# Altium schematic symbol library FPGA_Xilinx_Virtex7.SchLib: 34 symbols (part 7 of 34)
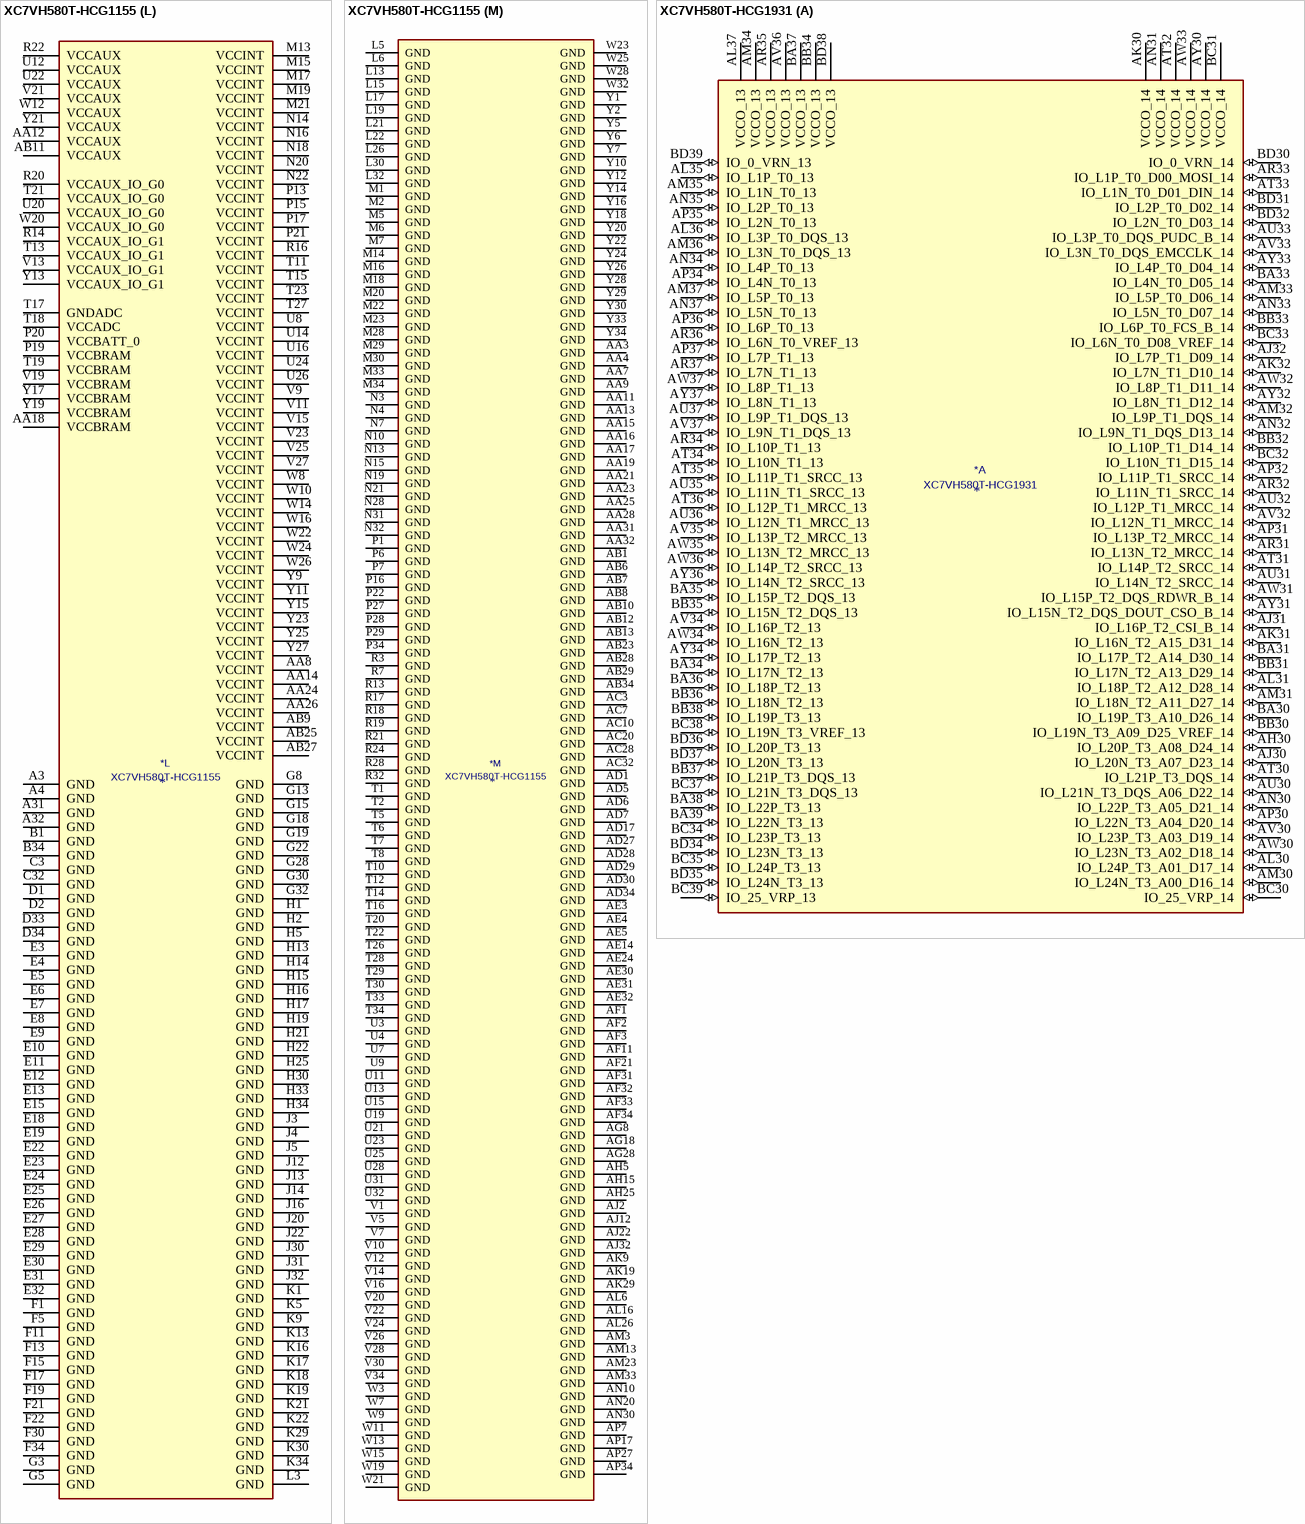
[diagram p178: symbols XC7VH580T-HCG1155 to XC7VH580T-HCG1931]

## XC7VH580T-HCG1155
designator *  value XC7VH580T-HCG1155
ki_keywords: FPGA; ki_description: Virtex 7 HT 580 XC7VH580T-FLG1155
part A pins: AB24 IO_L5P_T0_13 (io), AC23 IO_L1P_T0_13 (io), AC24 IO_L5N_T0_13 (io), AC25 VCCO_13 (power), AC26 IO_L4P_T0_13 (io), AC27 IO_L4N_T0_13 (io), AD23 IO_L1N_T0_13 (io), AD24 IO_L2P_T0_13 (io), AD25 IO_L2N_T0_13 (io), AD26 IO_L3P_T0_DQS_13 (io), AE23 IO_L16P_T2_13 (io), AE25 IO_L17P_T2_13 (io), AE26 IO_L3N_T0_DQS_13 (io), AE27 IO_L6P_T0_13 (io), AE28 IO_L1P_T0_D00_MOSI_14 (io), AE29 VCCO_14 (power), AF23 IO_L16N_T2_13 (io), AF24 IO_L15P_T2_DQS_13 (io), AF25 IO_L17N_T2_13 (io), AF26 VCCO_13 (power), AF27 IO_L6N_T0_VREF_13 (io), AF28 IO_L1N_T0_D01_DIN_14 (io), AF29 IO_L3P_T0_DQS_PUDC_B_14 (io), AF30 IO_L7P_T1_D09_14 (io), AG23 VCCO_13 (power), AG24 IO_L15N_T2_DQS_13 (io), AG25 IO_L14P_T2_SRCC_13 (io), AG26 IO_L14N_T2_SRCC_13 (io), AG27 IO_L7P_T1_13 (io), AG29 IO_L3N_T0_DQS_EMCCLK_14 (io), AG30 IO_L7N_T1_D10_14 (io), AG31 IO_L8P_T1_D11_14 (io), AG32 IO_L8N_T1_D12_14 (io), AG33 VCCO_14 (power), AG34 IO_L10P_T1_D14_14 (io), AH23 IO_L18P_T2_13 (io), AH24 IO_L13P_T2_MRCC_13 (io), AH26 IO_L9P_T1_DQS_13 (io), AH27 IO_L7N_T1_13 (io), AH28 IO_L4P_T0_D04_14 (io), AH29 IO_L4N_T0_D05_14 (io), AH30 VCCO_14 (power), AH31 IO_L11P_T1_SRCC_14 (io), AH32 IO_L9P_T1_DQS_14 (io), AH33 IO_L9N_T1_DQS_D13_14 (io), AH34 IO_L10N_T1_D15_14 (io), AJ23 IO_L18N_T2_13 (io), AJ24 IO_L13N_T2_MRCC_13 (io), AJ25 IO_L11P_T1_SRCC_13 (io), AJ26 IO_L9N_T1_DQS_13 (io), AJ27 VCCO_13 (power), AJ28 IO_L5P_T0_D06_14 (io), AJ29 IO_L2P_T0_D02_14 (io), AJ30 IO_L2N_T0_D03_14 (io), AJ31 IO_L11N_T1_SRCC_14 (io), AJ33 IO_L17P_T2_A14_D30_14 (io), AJ34 IO_L17N_T2_A13_D29_14 (io), AK23 IO_L20P_T3_13 (io), AK24 VCCO_13 (power), AK25 IO_L11N_T1_SRCC_13 (io), AK26 IO_L8P_T1_13 (io), AK27 IO_L8N_T1_13 (io), AK28 IO_L5N_T0_D07_14 (io), AK30 IO_L12P_T1_MRCC_14 (io), AK31 IO_L12N_T1_MRCC_14 (io), AK32 IO_L13P_T2_MRCC_14 (io), AK33 IO_L14P_T2_SRCC_14 (io), AK34 VCCO_14 (power), AL22 IO_L24P_T3_13 (io), AL23 IO_L20N_T3_13 (io), AL24 IO_L12P_T1_MRCC_13 (io), AL25 IO_L12N_T1_MRCC_13 (io), AL27 IO_0_VRN_13 (io), AL28 IO_L6P_T0_FCS_B_14 (io), AL29 IO_L6N_T0_D08_VREF_14 (io), AL30 IO_L21P_T3_DQS_14 (io), AL31 VCCO_14 (power), AL32 IO_L13N_T2_MRCC_14 (io), AL33 IO_L14N_T2_SRCC_14 (io), AL34 IO_L16P_T2_CSI_B_14 (io), AM22 IO_L24N_T3_13 (io), AM24 IO_L23P_T3_13 (io), AM25 IO_L10P_T1_13 (io), AM26 IO_L10N_T1_13 (io), AM27 IO_L20P_T3_A08_D24_14 (io), AM28 VCCO_14 (power), AM29 IO_L19P_T3_A10_D26_14 (io), AM30 IO_L21N_T3_DQS_A06_D22_14 (io), AM31 IO_L23P_T3_A03_D19_14 (io), AM32 IO_L15P_T2_DQS_RDWR_B_14 (io), AM34 IO_L16N_T2_A15_D31_14 (io), AN22 IO_25_VRP_13 (io), AN23 IO_L21P_T3_DQS_13 (io), AN24 IO_L23N_T3_13 (io), AN25 VCCO_13 (power), AN26 IO_L22P_T3_13 (io), AN27 IO_L20N_T3_A07_D23_14 (io), AN28 IO_L24P_T3_A01_D17_14 (io), AN29 IO_L19N_T3_A09_D25_VREF_14 (io), AN31 IO_L23N_T3_A02_D18_14 (io), AN32 IO_L15N_T2_DQS_DOUT_CSO_B_14 (io), AN33 IO_L18P_T2_A12_D28_14 (io), AN34 IO_0_VRN_14 (io), AP22 VCCO_13 (power), AP23 IO_L21N_T3_DQS_13 (io), AP24 IO_L19P_T3_13 (io), AP25 IO_L19N_T3_VREF_13 (io), AP26 IO_L22N_T3_13 (io), AP28 IO_L24N_T3_A00_D16_14 (io), AP29 IO_L22P_T3_A05_D21_14 (io), AP30 IO_L22N_T3_A04_D20_14 (io), AP31 IO_25_VRP_14 (io), AP32 VCCO_14 (power), AP33 IO_L18N_T2_A11_D27_14 (io)
part B pins: AA20 IO_L5P_T0_AD9P_15 (io), AA22 VCCO_15 (power), AB18 VCCO_15 (power), AB19 IO_0_VRN_15 (io), AB20 IO_L5N_T0_AD9N_15 (io), AB21 IO_L20P_T3_A20_15 (io), AB22 IO_L22P_T3_A17_15 (io), AC18 IO_L1P_T0_AD0P_15 (io), AC19 IO_L3P_T0_DQS_AD1P_15 (io), AC21 IO_L20N_T3_A19_15 (io), AC22 IO_L22N_T3_A16_15 (io), AD18 IO_L1N_T0_AD0N_15 (io), AD19 IO_L3N_T0_DQS_AD1N_15 (io), AD20 IO_L16P_T2_A28_15 (io), AD21 IO_L21P_T3_DQS_15 (io), AD22 VCCO_15 (power), AE18 IO_L4P_T0_15 (io), AE19 VCCO_15 (power), AE20 IO_L16N_T2_A27_15 (io), AE21 IO_L21N_T3_DQS_A18_15 (io), AE22 IO_L24P_T3_RS1_15 (io), AF18 IO_L4N_T0_15 (io), AF19 IO_L6P_T0_15 (io), AF20 IO_L18P_T2_A24_15 (io), AF22 IO_L24N_T3_RS0_15 (io), AG19 IO_L6N_T0_VREF_15 (io), AG20 IO_L18N_T2_A23_15 (io), AG21 IO_25_VRP_15 (io), AG22 IO_L23P_T3_FOE_B_15 (io), AH18 IO_L2P_T0_AD8P_15 (io), AH19 IO_L2N_T0_AD8N_15 (io), AH20 VCCO_15 (power), AH21 IO_L17P_T2_A26_15 (io), AH22 IO_L23N_T3_FWE_B_15 (io), AJ18 IO_L15P_T2_DQS_15 (io), AJ19 IO_L15N_T2_DQS_ADV_B_15 (io), AJ20 IO_L13P_T2_MRCC_15 (io), AJ21 IO_L17N_T2_A25_15 (io), AK18 IO_L7P_T1_AD2P_15 (io), AK20 IO_L13N_T2_MRCC_15 (io), AK21 IO_L19P_T3_A22_15 (io), AK22 IO_L19N_T3_A21_VREF_15 (io), AL18 IO_L7N_T1_AD2N_15 (io), AL19 IO_L14P_T2_SRCC_15 (io), AL20 IO_L14N_T2_SRCC_15 (io), AL21 VCCO_15 (power), AM18 VCCO_15 (power), AM19 IO_L12P_T1_MRCC_15 (io), AM20 IO_L12N_T1_MRCC_15 (io), AM21 IO_L11P_T1_SRCC_15 (io), AN18 IO_L10P_T1_AD11P_15 (io), AN19 IO_L9P_T1_DQS_AD3P_15 (io), AN21 IO_L11N_T1_SRCC_15 (io), AP18 IO_L10N_T1_AD11N_15 (io), AP19 IO_L9N_T1_DQS_AD3N_15 (io), AP20 IO_L8P_T1_AD10P_15 (io), AP21 IO_L8N_T1_AD10N_15 (io), F23 IO_25_VRP_16 (io), F24 IO_L8P_T1_16 (io), F25 IO_L8N_T1_16 (io), F26 VCCO_16 (power), F27 IO_L19P_T3_16 (io), F28 IO_L19N_T3_VREF_16 (io), F29 VCCO_16 (power), G23 VCCO_16 (power), G24 IO_L9N_T1_DQS_16 (io), G25 IO_L10P_T1_16 (io), G26 IO_L10N_T1_16 (io), G27 IO_L22N_T3_16 (io), G29 IO_L23N_T3_16 (io), H23 IO_L7P_T1_16 (io), H24 IO_L9P_T1_DQS_16 (io), H26 IO_L12N_T1_MRCC_16 (io), H27 IO_L22P_T3_16 (io), H28 IO_L21N_T3_DQS_16 (io), H29 IO_L23P_T3_16 (io), J23 IO_L6N_T0_VREF_16 (io), J24 IO_L7N_T1_16 (io), J25 IO_L11N_T1_SRCC_16 (io), J26 IO_L12P_T1_MRCC_16 (io), J27 VCCO_16 (power), J28 IO_L21P_T3_DQS_16 (io), J29 IO_L20N_T3_16 (io), K23 IO_L6P_T0_16 (io), K24 VCCO_16 (power), K25 IO_L11P_T1_SRCC_16 (io), K26 IO_L13P_T2_MRCC_16 (io), K27 IO_L13N_T2_MRCC_16 (io), K28 IO_L20P_T3_16 (io), L23 IO_L2P_T0_16 (io), L24 IO_L2N_T0_16 (io), L25 IO_L14N_T2_SRCC_16 (io), L27 IO_L17N_T2_16 (io), L28 IO_L24P_T3_16 (io), L29 IO_L24N_T3_16 (io), M24 IO_0_VRN_16 (io), M25 IO_L14P_T2_SRCC_16 (io), M26 IO_L17P_T2_16 (io), M27 IO_L18N_T2_16 (io), N23 IO_L4N_T0_16 (io), N24 IO_L3N_T0_DQS_16 (io), N25 VCCO_16 (power), N26 IO_L15N_T2_DQS_16 (io), N27 IO_L18P_T2_16 (io), P23 IO_L4P_T0_16 (io), P24 IO_L3P_T0_DQS_16 (io), P25 IO_L5N_T0_16 (io), P26 IO_L15P_T2_DQS_16 (io), R23 IO_L1P_T0_16 (io), R25 IO_L5P_T0_16 (io), R26 IO_L16P_T2_16 (io), R27 IO_L16N_T2_16 (io), T24 IO_L1N_T0_16 (io), T25 VCCO_16 (power)
part C pins: AC8 IO_L4P_T0_33 (io), AC9 IO_L2P_T0_33 (io), AC11 IO_L1N_T0_33 (io), AC12 IO_L1P_T0_33 (io), AD8 IO_L4N_T0_33 (io), AD9 IO_L2N_T0_33 (io), AD10 IO_L3N_T0_DQS_33 (io), AD11 IO_L3P_T0_DQS_33 (io), AD12 VCCO_33 (power), AE6 IO_L1P_T0_34 (io), AE7 IO_L5P_T0_34 (io), AE8 IO_L6P_T0_33 (io), AE9 VCCO_33 (power), AE10 IO_L5N_T0_33 (io), AE11 IO_L5P_T0_33 (io), AE12 IO_L16P_T2_33 (io), AF4 IO_L7P_T1_34 (io), AF5 IO_L1N_T0_34 (io), AF6 VCCO_34 (power), AF7 IO_L5N_T0_34 (io), AF8 IO_L6N_T0_VREF_33 (io), AF9 IO_L17P_T2_33 (io), AF10 IO_L15P_T2_DQS_33 (io), AF12 IO_L16N_T2_33 (io), AG1 IO_L10P_T1_34 (io), AG2 IO_L9P_T1_DQS_34 (io), AG3 VCCO_34 (power), AG4 IO_L7N_T1_34 (io), AG5 IO_L2N_T0_34 (io), AG6 IO_L2P_T0_34 (io), AG7 IO_L4P_T0_34 (io), AG9 IO_L17N_T2_33 (io), AG10 IO_L15N_T2_DQS_33 (io), AG11 IO_L13P_T2_MRCC_33 (io), AG12 IO_L18P_T2_33 (io), AH1 IO_L10N_T1_34 (io), AH2 IO_L9N_T1_DQS_34 (io), AH3 IO_L8N_T1_34 (io), AH4 IO_L8P_T1_34 (io), AH6 IO_L3P_T0_DQS_34 (io), AH7 IO_L4N_T0_34 (io), AH8 IO_L7N_T1_33 (io), AH9 IO_L7P_T1_33 (io), AH10 VCCO_33 (power), AH11 IO_L13N_T2_MRCC_33 (io), AH12 IO_L18N_T2_33 (io), AJ1 IO_L17P_T2_34 (io), AJ3 IO_L11N_T1_SRCC_34 (io), AJ4 IO_L11P_T1_SRCC_34 (io), AJ5 IO_L12P_T1_MRCC_34 (io), AJ6 IO_L3N_T0_DQS_34 (io), AJ7 VCCO_34 (power), AJ8 IO_L9N_T1_DQS_33 (io), AJ9 IO_L9P_T1_DQS_33 (io), AJ10 IO_L14N_T2_SRCC_33 (io), AJ11 IO_L14P_T2_SRCC_33 (io), AK1 IO_L17N_T2_34 (io), AK2 IO_L14P_T2_SRCC_34 (io), AK3 IO_L13P_T2_MRCC_34 (io), AK4 VCCO_34 (power), AK5 IO_L12N_T1_MRCC_34 (io), AK6 IO_L6N_T0_VREF_34 (io), AK7 IO_L6P_T0_34 (io), AK8 IO_L8P_T1_33 (io), AK10 IO_L11N_T1_SRCC_33 (io), AK11 IO_L11P_T1_SRCC_33 (io), AK12 IO_L20P_T3_33 (io), AL1 VCCO_34 (power), AL2 IO_L14N_T2_SRCC_34 (io), AL3 IO_L13N_T2_MRCC_34 (io), AL4 IO_L23N_T3_34 (io), AL5 IO_L23P_T3_34 (io), AL7 IO_L20P_T3_34 (io), AL8 IO_L8N_T1_33 (io), AL9 IO_L12N_T1_MRCC_33 (io), AL10 IO_L12P_T1_MRCC_33 (io), AL11 VCCO_33 (power), AL12 IO_L20N_T3_33 (io), AM1 IO_L16P_T2_34 (io), AM2 IO_L15P_T2_DQS_34 (io), AM4 IO_L21P_T3_DQS_34 (io), AM5 IO_L19N_T3_VREF_34 (io), AM6 IO_L19P_T3_34 (io), AM7 IO_L20N_T3_34 (io), AM8 VCCO_33 (power), AM9 IO_L10N_T1_33 (io), AM10 IO_L10P_T1_33 (io), AM11 IO_L24N_T3_33 (io), AM12 IO_L24P_T3_33 (io), AN1 IO_L16N_T2_34 (io), AN2 IO_L15N_T2_DQS_34 (io), AN3 IO_L18P_T2_34 (io), AN4 IO_L21N_T3_DQS_34 (io), AN5 VCCO_34 (power), AN6 IO_L24N_T3_34 (io), AN7 IO_L24P_T3_34 (io), AN8 IO_L22N_T3_33 (io), AN9 IO_L22P_T3_33 (io), AN11 IO_L21N_T3_DQS_33 (io), AN12 IO_L21P_T3_DQS_33 (io), AN13 IO_L23P_T3_33 (io), AP1 IO_0_VRN_34 (io), AP2 VCCO_34 (power), AP3 IO_L18N_T2_34 (io), AP4 IO_25_VRP_34 (io), AP5 IO_L22N_T3_34 (io), AP6 IO_L22P_T3_34 (io), AP8 IO_0_VRN_33 (io), AP9 IO_L19N_T3_VREF_33 (io), AP10 IO_L19P_T3_33 (io), AP11 IO_25_VRP_33 (io), AP12 VCCO_33 (power), AP13 IO_L23N_T3_33 (io)
part D pins: AB14 IO_L20P_T3_35 (io), AB15 IO_0_VRN_35 (io), AB16 IO_L4P_T0_35 (io), AB17 IO_L1P_T0_AD4P_35 (io), AC13 IO_L22P_T3_35 (io), AC14 IO_L20N_T3_35 (io), AC15 VCCO_35 (power), AC16 IO_L4N_T0_35 (io), AC17 IO_L1N_T0_AD4N_35 (io), AD13 IO_L22N_T3_35 (io), AD14 IO_25_VRP_35 (io), AD15 IO_L16P_T2_35 (io), AD16 IO_L3P_T0_DQS_AD5P_35 (io), AE13 IO_L24P_T3_35 (io), AE15 IO_L16N_T2_35 (io), AE16 IO_L3N_T0_DQS_AD5N_35 (io), AE17 IO_L5P_T0_AD13P_35 (io), AF13 IO_L24N_T3_35 (io), AF14 IO_L21P_T3_DQS_35 (io), AF15 IO_L18P_T2_35 (io), AF16 VCCO_35 (power), AF17 IO_L5N_T0_AD13N_35 (io), AG13 VCCO_35 (power), AG14 IO_L21N_T3_DQS_35 (io), AG15 IO_L18N_T2_35 (io), AG16 IO_L6P_T0_35 (io), AG17 IO_L2P_T0_AD12P_35 (io), AH13 IO_L23P_T3_35 (io), AH14 IO_L19P_T3_35 (io), AH16 IO_L6N_T0_VREF_35 (io), AH17 IO_L2N_T0_AD12N_35 (io), AJ13 IO_L23N_T3_35 (io), AJ14 IO_L19N_T3_VREF_35 (io), AJ15 IO_L13P_T2_MRCC_35 (io), AJ16 IO_L15P_T2_DQS_35 (io), AJ17 VCCO_35 (power), AK13 IO_L17P_T2_35 (io), AK14 VCCO_35 (power), AK15 IO_L13N_T2_MRCC_35 (io), AK16 IO_L15N_T2_DQS_35 (io), AK17 IO_L7P_T1_AD6P_35 (io), AL13 IO_L17N_T2_35 (io), AL14 IO_L14N_T2_SRCC_35 (io), AL15 IO_L14P_T2_SRCC_35 (io), AL17 IO_L7N_T1_AD6N_35 (io), AM14 IO_L11P_T1_SRCC_35 (io), AM15 IO_L12N_T1_MRCC_35 (io), AM16 IO_L12P_T1_MRCC_35 (io), AM17 IO_L9P_T1_DQS_AD7P_35 (io), AN14 IO_L11N_T1_SRCC_35 (io), AN15 VCCO_35 (power), AN16 IO_L8P_T1_AD14P_35 (io), AN17 IO_L9N_T1_DQS_AD7N_35 (io), AP14 IO_L10N_T1_AD15N_35 (io), AP15 IO_L10P_T1_AD15P_35 (io), AP16 IO_L8N_T1_AD14N_35 (io), F6 VCCO_36 (power), F7 IO_L22N_T3_36 (io), F8 IO_L22P_T3_36 (io), F9 IO_L10N_T1_36 (io), F10 IO_25_VRP_36 (io), F12 IO_L8N_T1_36 (io), G6 IO_L23N_T3_36 (io), G7 IO_L21N_T3_DQS_36 (io), G9 IO_L10P_T1_36 (io), G10 IO_L9N_T1_DQS_36 (io), G11 IO_L9P_T1_DQS_36 (io), G12 IO_L8P_T1_36 (io), H6 IO_L23P_T3_36 (io), H7 IO_L21P_T3_DQS_36 (io), H8 IO_L19N_T3_VREF_36 (io), H9 IO_L12N_T1_MRCC_36 (io), H10 VCCO_36 (power), H11 IO_L7N_T1_36 (io), H12 IO_L7P_T1_36 (io), J6 IO_L20N_T3_36 (io), J7 VCCO_36 (power), J8 IO_L19P_T3_36 (io), J9 IO_L12P_T1_MRCC_36 (io), J10 IO_L11N_T1_SRCC_36 (io), J11 IO_L6N_T0_VREF_36 (io), K6 IO_L20P_T3_36 (io), K7 IO_L24N_T3_36 (io), K8 IO_L17N_T2_36 (io), K10 IO_L11P_T1_SRCC_36 (io), K11 IO_L6P_T0_36 (io), K12 IO_L2N_T0_36 (io), L7 IO_L24P_T3_36 (io), L8 IO_L17P_T2_36 (io), L9 IO_L13N_T2_MRCC_36 (io), L10 IO_L14N_T2_SRCC_36 (io), L11 VCCO_36 (power), L12 IO_L2P_T0_36 (io), M8 VCCO_36 (power), M9 IO_L13P_T2_MRCC_36 (io), M10 IO_L14P_T2_SRCC_36 (io), M11 IO_L4N_T0_36 (io), M12 IO_L4P_T0_36 (io), N8 IO_L18N_T2_36 (io), N9 IO_L15N_T2_DQS_36 (io), N11 IO_L3N_T0_DQS_36 (io), N12 IO_0_VRN_36 (io), P8 IO_L18P_T2_36 (io), P9 IO_L15P_T2_DQS_36 (io), P10 IO_L5N_T0_36 (io), P11 IO_L3P_T0_DQS_36 (io), P12 VCCO_36 (power), R8 IO_L16N_T2_36 (io), R9 VCCO_36 (power), R10 IO_L5P_T0_36 (io), R11 IO_L1N_T0_36 (io), R12 IO_L1P_T0_36 (io), T9 IO_L16P_T2_36 (io)
part E pins: AA1 MGTHTXN1_113 (io), AA2 MGTHTXP1_113 (io), AA5 MGTREFCLK1N_113 (io), AA6 MGTREFCLK1P_113 (io), AB3 MGTHRXN2_113 (io), AB4 MGTHRXP2_113 (io), AC1 MGTHTXN0_113 (io), AC2 MGTHTXP0_113 (io), AC5 MGTREFCLK0N_113 (io), AC6 MGTREFCLK0P_113 (io), AD3 MGTHRXN1_113 (io), AD4 MGTHRXP1_113 (io), J1 MGTHTXN3_114 (io), J2 MGTHTXP3_114 (io), K3 MGTHRXN2_114 (io), K4 MGTHRXP2_114 (io), L1 MGTHTXN2_114 (io), L2 MGTHTXP2_114 (io), M3 MGTHRXN3_114 (io), M4 MGTHRXP3_114 (io), N1 MGTHTXN1_114 (io), N2 MGTHTXP1_114 (io), P3 MGTHRXN1_114 (io), P4 MGTHRXP1_114 (io), R1 MGTHTXN0_114 (io), R2 MGTHTXP0_114 (io), T3 MGTHRXN0_114 (io), T4 MGTHRXP0_114 (io), U1 MGTHTXN3_113 (io), U2 MGTHTXP3_113 (io), U5 MGTREFCLK1N_114 (io), U6 MGTREFCLK1P_114 (io), V3 MGTHRXN3_113 (io), V4 MGTHRXP3_113 (io), W1 MGTHTXN2_113 (io), W2 MGTHTXP2_113 (io), W5 MGTREFCLK0N_114 (io), W6 MGTREFCLK0P_114 (io), Y3 MGTHRXN0_113 (io), Y4 MGTHRXP0_113 (io)
part F pins: A1 MGTHTXN3_115 (io), A2 MGTHTXP3_115 (io), AA29 MGTREFCLK1P_213 (io), AA30 MGTREFCLK1N_213 (io), AA33 MGTHTXP1_213 (io), AA34 MGTHTXN1_213 (io), AB31 MGTHRXP2_213 (io), AB32 MGTHRXN2_213 (io), AC29 MGTREFCLK0P_213 (io), AC30 MGTREFCLK0N_213 (io), AC33 MGTHTXP0_213 (io), AC34 MGTHTXN0_213 (io), AD31 MGTHRXP1_213 (io), AD32 MGTHRXN1_213 (io), B3 MGTHRXN3_115 (io), B4 MGTHRXP3_115 (io), C1 MGTHTXN2_115 (io), C2 MGTHTXP2_115 (io), D3 MGTHRXN2_115 (io), D4 MGTHRXP2_115 (io), E1 MGTHTXN1_115 (io), E2 MGTHTXP1_115 (io), F3 MGTHRXN1_115 (io), F4 MGTHRXP1_115 (io), G1 MGTHTXN0_115 (io), G2 MGTHTXP0_115 (io), H3 MGTHRXN0_115 (io), H4 MGTHRXP0_115 (io), N5 MGTREFCLK0N_115 (io), N6 MGTREFCLK0P_115 (io), R5 MGTREFCLK1N_115 (io), R6 MGTREFCLK1P_115 (io), U33 MGTHTXP3_213 (io), U34 MGTHTXN3_213 (io), V31 MGTHRXP3_213 (io), V32 MGTHRXN3_213 (io), W33 MGTHTXP2_213 (io), W34 MGTHTXN2_213 (io), Y31 MGTHRXP0_213 (io), Y32 MGTHRXN0_213 (io)
part G pins: A33 MGTHTXP3_215 (io), A34 MGTHTXN3_215 (io), B31 MGTHRXP3_215 (io), B32 MGTHRXN3_215 (io), C33 MGTHTXP2_215 (io), C34 MGTHTXN2_215 (io), D31 MGTHRXP2_215 (io), D32 MGTHRXN2_215 (io), E33 MGTHTXP1_215 (io), E34 MGTHTXN1_215 (io), F31 MGTHRXP1_215 (io), F32 MGTHRXN1_215 (io), G33 MGTHTXP0_215 (io), G34 MGTHTXN0_215 (io), H31 MGTHRXP0_215 (io), H32 MGTHRXN0_215 (io), J33 MGTHTXP3_214 (io), J34 MGTHTXN3_214 (io), K31 MGTHRXP2_214 (io), K32 MGTHRXN2_214 (io), L33 MGTHTXP2_214 (io), L34 MGTHTXN2_214 (io), M31 MGTHRXP3_214 (io), M32 MGTHRXN3_214 (io), N29 MGTREFCLK0P_215 (io), N30 MGTREFCLK0N_215 (io), N33 MGTHTXP1_214 (io), N34 MGTHTXN1_214 (io), P31 MGTHRXP1_214 (io), P32 MGTHRXN1_214 (io), R29 MGTREFCLK1P_215 (io), R30 MGTREFCLK1N_215 (io), R33 MGTHTXP0_214 (io), R34 MGTHTXN0_214 (io), T31 MGTHRXP0_214 (io), T32 MGTHRXN0_214 (io), U29 MGTREFCLK1P_214 (io), U30 MGTREFCLK1N_214 (io), W29 MGTREFCLK0P_214 (io), W30 MGTREFCLK0N_214 (io)
part H pins: AB2 MGTAVTT_G10 (power), AB5 MGTAVCC_G10 (power), AB30 MGTAVCC_G20 (power), AB33 MGTAVTT_G20 (power), AC4 MGTAVCC_G10 (power), AC31 MGTAVCC_G20 (power), AD2 MGTAVTT_G10 (power), AD33 MGTAVTT_G20 (power), AE1 MGTRREF_115 (power), AE2 MGTAVTTRCAL_115 (power), AE33 MGTAVTTRCAL_215 (power), AE34 MGTRREF_215 (power), B2 MGTAVTT_G10 (power), B33 MGTAVTT_G20 (power), C4 MGTAVCC_G10 (power), C31 MGTAVCC_G20 (power), F2 MGTAVTT_G10 (power), F33 MGTAVTT_G20 (power), G4 MGTAVCC_G10 (power), G31 MGTAVCC_G20 (power), K2 MGTAVTT_G10 (power), K33 MGTAVTT_G20 (power), L4 MGTAVCC_G10 (power), L31 MGTAVCC_G20 (power), P2 MGTAVTT_G10 (power), P5 MGTAVCC_G10 (power), P30 MGTAVCC_G20 (power), P33 MGTAVTT_G20 (power), R4 MGTAVCC_G10 (power), R31 MGTAVCC_G20 (power), V2 MGTAVTT_G10 (power), V6 MGTVCCAUX_G10 (power), V29 MGTVCCAUX_G20 (power), V33 MGTAVTT_G20 (power), W4 MGTAVCC_G10 (power), W31 MGTAVCC_G20 (power)
part I pins: A6 MGTZRXN7_300 (io), A7 MGTZRXP7_300 (io), A9 MGTZRXN5_300 (io), A10 MGTZRXP5_300 (io), A12 MGTZTXN7_300 (io), A13 MGTZTXP7_300 (io), A15 MGTZTXN5_300 (io), A16 MGTZTXP5_300 (io), A18 MGTZRXN3_300 (io), A19 MGTZRXP3_300 (io), A21 MGTZRXN1_300 (io), A22 MGTZRXP1_300 (io), A24 MGTZTXN3_300 (io), A25 MGTZTXP3_300 (io), A27 MGTZTXN1_300 (io), A28 MGTZTXP1_300 (io), C7 MGTZRXN6_300 (io), C8 MGTZRXP6_300 (io), C10 MGTZRXN4_300 (io), C11 MGTZRXP4_300 (io), C13 MGTZTXN6_300 (io), C14 MGTZTXP6_300 (io), C16 MGTZTXN4_300 (io), C17 MGTZTXP4_300 (io), C19 MGTZRXN2_300 (io), C20 MGTZRXP2_300 (io), C22 MGTZRXN0_300 (io), C23 MGTZRXP0_300 (io), C25 MGTZTXN2_300 (io), C26 MGTZTXP2_300 (io), C28 MGTZTXN0_300 (io), C29 MGTZTXP0_300 (io), E16 MGTZREFCLK0N_300 (io), E17 MGTZREFCLK0P_300 (io), E20 MGTZREFCLK1N_300 (io), E21 MGTZREFCLK1P_300 (io), G16 MGTZ_THERM_OUT_300 (io), G17 MGTZ_THERM_IN_300 (io), H18 MGTZ_OBS_CLK_N_300 (io), J18 MGTZ_OBS_CLK_P_300 (io)
part J pins: A5 MGTZAGND_300 (power), A8 MGTZAGND_300 (power), A11 MGTZAGND_300 (power), A14 MGTZAGND_300 (power), A17 MGTZAGND_300 (power), A20 MGTZAGND_300 (power), A23 MGTZAGND_300 (power), A26 MGTZAGND_300 (power), A29 MGTZAGND_300 (power), A30 MGTZAGND_300 (power), B5 MGTZAGND_300 (power), B6 MGTZAVCC_300 (power), B7 MGTZAGND_300 (power), B8 MGTZAVCC_300 (power), B9 MGTZAGND_300 (power), B10 MGTZAVCC_300 (power), B11 MGTZAGND_300 (power), B12 MGTZAVCC_300 (power), B13 MGTZAGND_300 (power), B14 MGTZAVCC_300 (power), B15 MGTZAGND_300 (power), B16 MGTZAVCC_300 (power), B17 MGTZAGND_300 (power), B18 MGTZAVCC_300 (power), B19 MGTZAGND_300 (power), B20 MGTZAVCC_300 (power), B21 MGTZAGND_300 (power), B22 MGTZAVCC_300 (power), B23 MGTZAGND_300 (power), B24 MGTZAVCC_300 (power), B25 MGTZAGND_300 (power), B26 MGTZAVCC_300 (power), B27 MGTZAGND_300 (power), B28 MGTZAVCC_300 (power), B29 MGTZAGND_300 (power), B30 MGTZAGND_300 (power), C5 MGTZAGND_300 (power), C6 MGTZAGND_300 (power), C9 MGTZAGND_300 (power), C12 MGTZAGND_300 (power), C15 MGTZAGND_300 (power), C18 MGTZAGND_300 (power), C21 MGTZAGND_300 (power), C24 MGTZAGND_300 (power), C27 MGTZAGND_300 (power), C30 MGTZAGND_300 (power), D5 MGTZAGND_300 (power), D6 MGTZAGND_300 (power), D7 MGTZAGND_300 (power), D8 MGTZAGND_300 (power), D9 MGTZAGND_300 (power), D10 MGTZAGND_300 (power), D11 MGTZAGND_300 (power), D12 MGTZAGND_300 (power), D13 MGTZAGND_300 (power), D14 MGTZAGND_300 (power), D15 MGTZAGND_300 (power), D16 MGTZAGND_300 (power), D17 MGTZAGND_300 (power), D18 MGTZAGND_300 (power), D19 MGTZAGND_300 (power), D20 MGTZAGND_300 (power), D21 MGTZAGND_300 (power), D22 MGTZAGND_300 (power), D23 MGTZAGND_300 (power), D24 MGTZAGND_300 (power), D25 MGTZAGND_300 (power), D26 MGTZAGND_300 (power), D27 MGTZAGND_300 (power), D28 MGTZAGND_300 (power), D29 MGTZAGND_300 (power), D30 MGTZAGND_300 (power), E14 MGTZ_SENSE_AVCC_300 (power), F14 MGTZ_SENSE_AGND_300 (power), F16 MGTZVCCH_300 (power), F18 MGTZVCCH_300 (power), F20 MGTZVCCH_300 (power), G14 MGTZVCCH_300 (power), G20 MGTZ_SENSE_GND_300 (power), G21 MGTZ_SENSE_VCCH_300 (power), H20 MGTZ_SENSE_VCC_300 (power), J15 MGTZVCCH_300 (power), J17 MGTZVCCH_300 (power), J19 MGTZVCCH_300 (power), J21 MGTZVCCH_300 (power), K14 MGTZ_SENSE_GNDL_300 (power), K15 MGTZ_SENSE_VCCL_300 (power), L14 MGTZVCCL_300 (power), L16 MGTZVCCL_300 (power), L18 MGTZVCCL_300 (power), L20 MGTZVCCL_300 (power)
part K pins: AA10 VCCO_0 (power), AA27 M2_0 (io), AB26 M0_0 (io), K20 TDO_0 (io), N17 TCK_0 (io), P14 TDI_0 (io), P18 CCLK_0 (io), R15 TMS_0 (io), U10 VCCO_0 (power), U17 VREFN_0 (io), U18 VP_0 (io), U27 DONE_0 (io), V8 INIT_B_0 (io), V17 VN_0 (io), V18 VREFP_0 (io), W17 DXN_0 (io), W18 DXP_0 (io), W27 PROGRAM_B_0 (io), Y8 M1_0 (io)
part L pins: A3 GND (power), A4 GND (power), A31 GND (power), A32 GND (power), AA8 VCCINT (power), AA12 VCCAUX (power), AA14 VCCINT (power), AA18 VCCBRAM (power), AA24 VCCINT (power), AA26 VCCINT (power), AB9 VCCINT (power), AB11 VCCAUX (power), AB25 VCCINT (power), AB27 VCCINT (power), B1 GND (power), B34 GND (power), C3 GND (power), C32 GND (power), D1 GND (power), D2 GND (power), D33 GND (power), D34 GND (power), E3 GND (power), E4 GND (power), E5 GND (power), E6 GND (power), E7 GND (power), E8 GND (power), E9 GND (power), E10 GND (power), E11 GND (power), E12 GND (power), E13 GND (power), E15 GND (power), E18 GND (power), E19 GND (power), E22 GND (power), E23 GND (power), E24 GND (power), E25 GND (power), E26 GND (power), E27 GND (power), E28 GND (power), E29 GND (power), E30 GND (power), E31 GND (power), E32 GND (power), F1 GND (power), F5 GND (power), F11 GND (power), F13 GND (power), F15 GND (power), F17 GND (power), F19 GND (power), F21 GND (power), F22 GND (power), F30 GND (power), F34 GND (power), G3 GND (power), G5 GND (power), G8 GND (power), G13 GND (power), G15 GND (power), G18 GND (power), G19 GND (power), G22 GND (power), G28 GND (power), G30 GND (power), G32 GND (power), H1 GND (power), H2 GND (power), H5 GND (power), H13 GND (power), H14 GND (power), H15 GND (power), H16 GND (power), H17 GND (power), H19 GND (power), H21 GND (power), H22 GND (power), H25 GND (power), H30 GND (power), H33 GND (power), H34 GND (power), J3 GND (power), J4 GND (power), J5 GND (power), J12 GND (power), J13 GND (power), J14 GND (power), J16 GND (power), J20 GND (power), J22 GND (power), J30 GND (power), J31 GND (power), J32 GND (power), K1 GND (power), K5 GND (power), K9 GND (power), K13 GND (power), K16 GND (power), K17 GND (power), K18 GND (power), K19 GND (power), K21 GND (power), K22 GND (power), K29 GND (power), K30 GND (power), K34 GND (power), L3 GND (power), M13 VCCINT (power), M15 VCCINT (power), M17 VCCINT (power), M19 VCCINT (power), M21 VCCINT (power), N14 VCCINT (power), N16 VCCINT (power), N18 VCCINT (power), N20 VCCINT (power), N22 VCCINT (power), P13 VCCINT (power), P15 VCCINT (power), P17 VCCINT (power), P19 VCCBRAM (power), P20 VCCBATT_0 (power), P21 VCCINT (power), R14 VCCAUX_IO_G1 (power), R16 VCCINT (power), R20 VCCAUX_IO_G0 (power), R22 VCCAUX (power), T11 VCCINT (power), T13 VCCAUX_IO_G1 (power), T15 VCCINT (power), T17 GNDADC (power), T18 VCCADC (power), T19 VCCBRAM (power), T21 VCCAUX_IO_G0 (power), T23 VCCINT (power), T27 VCCINT (power), U8 VCCINT (power), U12 VCCAUX (power), U14 VCCINT (power), U16 VCCINT (power), U20 VCCAUX_IO_G0 (power), U22 VCCAUX (power), U24 VCCINT (power), U26 VCCINT (power), V9 VCCINT (power), V11 VCCINT (power), V13 VCCAUX_IO_G1 (power), V15 VCCINT (power), V19 VCCBRAM (power), V21 VCCAUX (power), V23 VCCINT (power), V25 VCCINT (power), V27 VCCINT (power), W8 VCCINT (power), W10 VCCINT (power), W12 VCCAUX (power), W14 VCCINT (power), W16 VCCINT (power), W20 VCCAUX_IO_G0 (power), W22 VCCINT (power), W24 VCCINT (power), W26 VCCINT (power), Y9 VCCINT (power), Y11 VCCINT (power), Y13 VCCAUX_IO_G1 (power), Y15 VCCINT (power), Y17 VCCBRAM (power), Y19 VCCBRAM (power), Y21 VCCAUX (power), Y23 VCCINT (power), Y25 VCCINT (power), Y27 VCCINT (power)